# Altium footprint library TeCrea-Misc.PCBLIB: 105 footprints (part 4 of 7)
Each footprint in its own frame and in the unit in brackets; x right, y up, seen from the top. Pads: shape width x height; smd on the part's side, far side on the other; paste and mask are expansions set on the pad; w line width, h text height; cw(c..) or ccw(c..) is an arc to the next point about the centre after c.
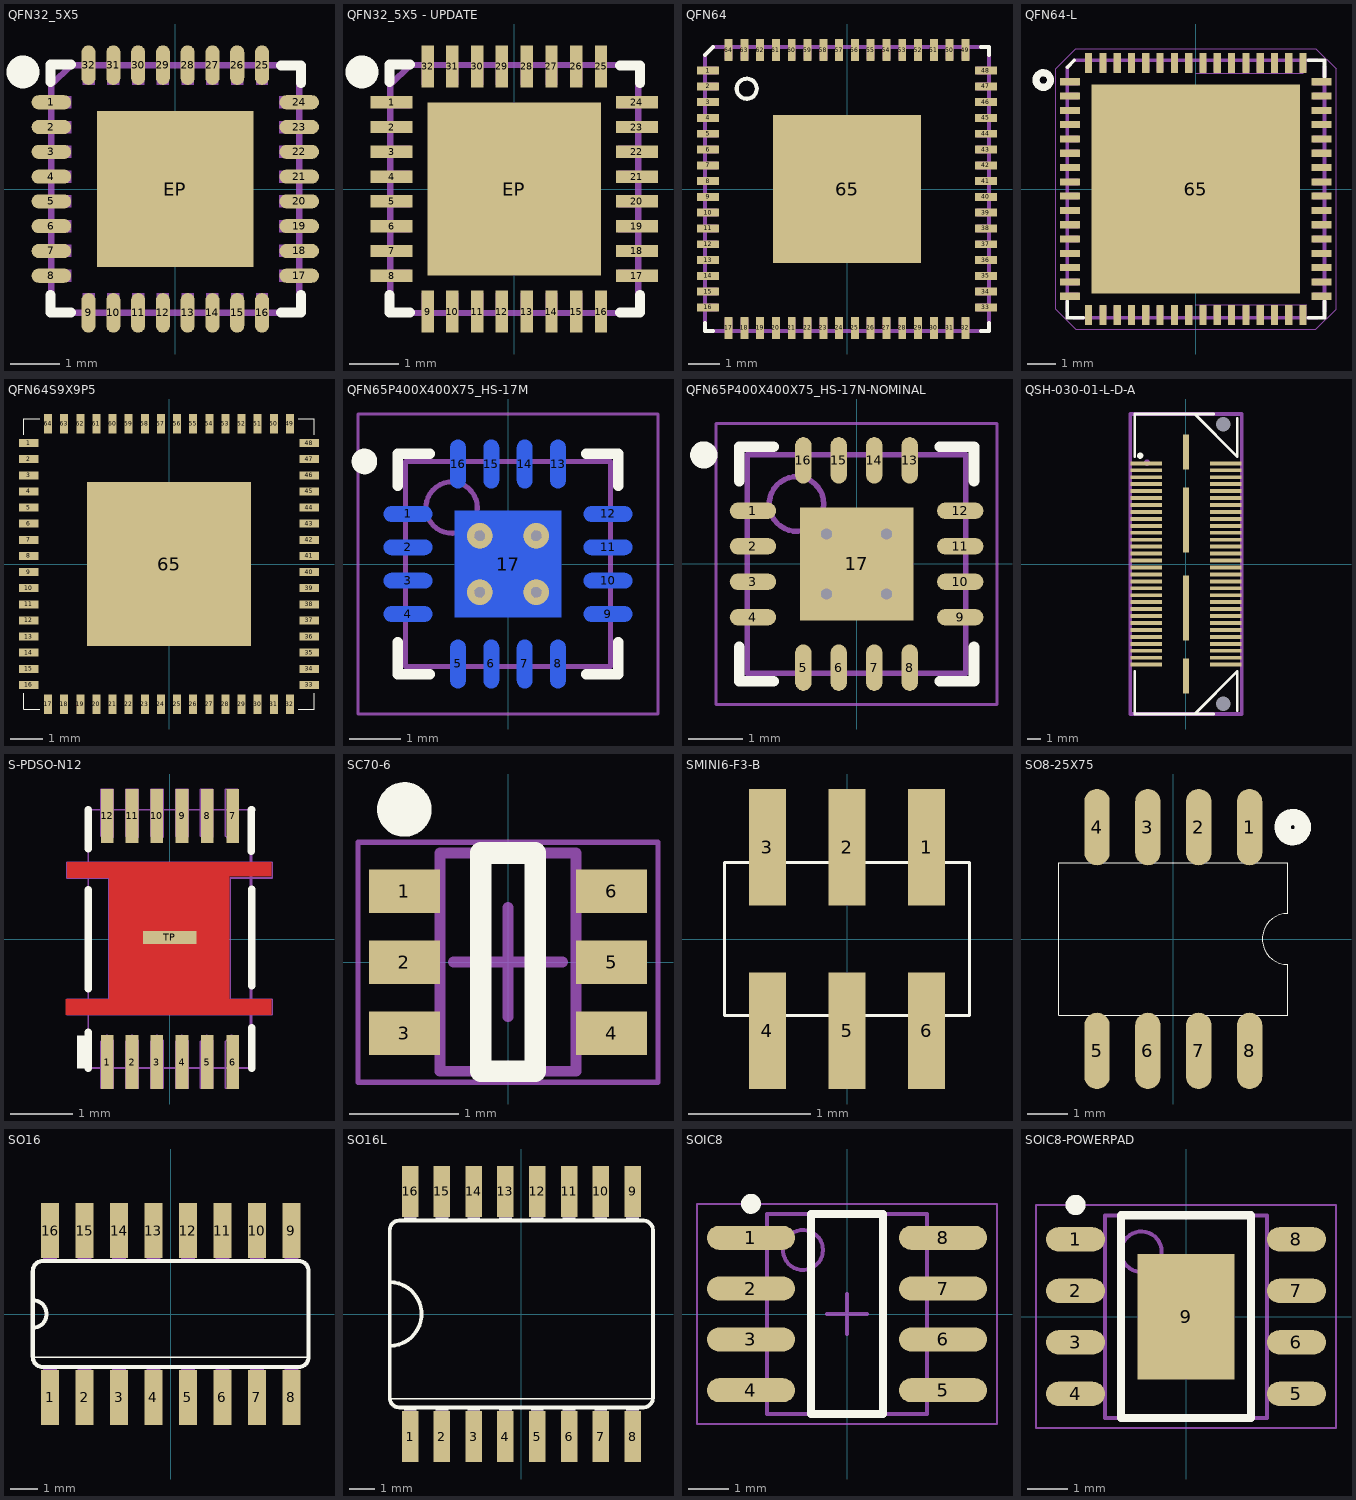
[diagram p3: the footprints below, top view; thin cyan lines are the x and y axes]

## QFN32_5X5 [mil]
pads (33):
  oval 31.5x11.2 smd: 1(-98.43,68.9) 2(-98.43,49.21) 3(-98.43,29.53) 4(-98.43,9.84) 5(-98.43,-9.84) 6(-98.43,-29.53) 7(-98.43,-49.21) 8(-98.43,-68.9) 17(98.43,-68.9) 18(98.43,-49.21) 19(98.43,-29.53) 20(98.43,-9.84) 21(98.43,9.84) 22(98.43,29.53) 23(98.43,49.21) 24(98.43,68.9)
  oval 11.2x31.5 smd: 9(-68.9,-98.43) 10(-49.21,-98.43) 11(-29.53,-98.43) 12(-9.84,-98.43) 13(9.84,-98.43) 14(29.53,-98.43) 15(49.21,-98.43) 16(68.9,-98.43) 25(68.9,98.43) 26(49.21,98.43) 27(29.53,98.43) 28(9.84,98.43) 29(-9.84,98.43) 30(-29.53,98.43) 31(-49.21,98.43) 32(-68.9,98.43)
  rect 124.02x124.02 smd paste+0: EP(0,0)
Top Overlay:
  circle w19.68: c-121,93 r3.16
  lines w7.87: -99,-84 -99,-98 -83,-98 ; -99,85 -99,99 -83,99 ; 84,-98 100,-98 100,-84 ; 84,98 100,98 100,84
Top Paste:
  region: 57.09,-5.91 57.09,-57.09 5.91,-57.09 5.91,-5.91
  region: -5.91,-57.09 -57.09,-57.09 -57.09,-5.91 -5.91,-5.91
  region: 5.91,57.09 57.09,57.09 57.09,5.91 5.91,5.91
  region: -57.09,5.91 -57.09,57.09 -5.91,57.09 -5.91,5.91
Mechanical 8:
  region: -64.17,-98.43 -73.62,-98.43 -73.62,-82.68 -64.17,-82.68
  region: -44.49,-98.43 -53.94,-98.43 -53.94,-82.68 -44.49,-82.68
  region: -24.8,-98.43 -34.25,-98.43 -34.25,-82.68 -24.8,-82.68
  region: 73.62,-98.43 64.17,-98.43 64.17,-82.68 73.62,-82.68
  region: 53.94,-98.43 44.49,-98.43 44.49,-82.68 53.94,-82.68
  region: 34.25,-98.43 24.8,-98.43 24.8,-82.68 34.25,-82.68
  region: 14.57,-98.43 5.12,-98.43 5.12,-82.68 14.57,-82.68
  region: -5.12,-98.43 -14.57,-98.43 -14.57,-82.68 -5.12,-82.68
  region: -98.43,64.17 -98.43,73.62 -82.68,73.62 -82.68,64.17
  region: -98.43,44.49 -98.43,53.94 -82.68,53.94 -82.68,44.49
  region: -98.43,24.8 -98.43,34.25 -82.68,34.25 -82.68,24.8
  region: -98.43,-73.62 -98.43,-64.17 -82.68,-64.17 -82.68,-73.62
  region: -98.43,-53.94 -98.43,-44.49 -82.68,-44.49 -82.68,-53.94
  region: -98.43,-34.25 -98.43,-24.8 -82.68,-24.8 -82.68,-34.25
  region: -98.43,-14.57 -98.43,-5.12 -82.68,-5.12 -82.68,-14.57
  region: -98.43,5.12 -98.43,14.57 -82.68,14.57 -82.68,5.12
  region: 98.43,-64.17 98.43,-73.62 82.68,-73.62 82.68,-64.17
  region: 98.43,-44.49 98.43,-53.94 82.68,-53.94 82.68,-44.49
  region: 98.43,-24.8 98.43,-34.25 82.68,-34.25 82.68,-24.8
  region: 98.43,73.62 98.43,64.17 82.68,64.17 82.68,73.62
  region: 98.43,53.94 98.43,44.49 82.68,44.49 82.68,53.94
  region: 98.43,34.25 98.43,24.8 82.68,24.8 82.68,34.25
  region: 98.43,14.57 98.43,5.12 82.68,5.12 82.68,14.57
  region: 98.43,-5.12 98.43,-14.57 82.68,-14.57 82.68,-5.12
  region: 64.17,98.43 73.62,98.43 73.62,82.68 64.17,82.68
  region: 44.49,98.43 53.94,98.43 53.94,82.68 44.49,82.68
  region: 24.8,98.43 34.25,98.43 34.25,82.68 24.8,82.68
  region: -73.62,98.43 -64.17,98.43 -64.17,82.68 -73.62,82.68
  region: -53.94,98.43 -44.49,98.43 -44.49,82.68 -53.94,82.68
  region: -34.25,98.43 -24.8,98.43 -24.8,82.68 -34.25,82.68
  region: -14.57,98.43 -5.12,98.43 -5.12,82.68 -14.57,82.68
  region: 5.12,98.43 14.57,98.43 14.57,82.68 5.12,82.68
  lines w5: -98.43,-98.43 98.43,-98.43 98.43,98.43 -98.43,98.43 -98.43,-98.43
Mechanical 22:
  lines w5: -98.43,-82.68 -98.43,-98.43 -82.68,-98.43 ; -98.43,82.68 -82.68,98.43 ; 82.68,-98.43 98.43,-98.43 98.43,-82.68 ; 82.68,98.43 98.43,98.43 98.43,82.68
3D body "QFN32-5x5.step": height 31.5, standoff 0, extent -98.81,-98.81 98.83,98.83

## QFN32_5X5 - UPDATE [mm]
pads (33):
  rect 0.85x0.25 smd mask+0.068: 1(-2.475,1.75) 2(-2.475,1.25) 3(-2.475,0.75) 4(-2.475,0.25) 5(-2.475,-0.25) 6(-2.475,-0.75) 7(-2.475,-1.25) 8(-2.475,-1.75) 17(2.475,-1.75) 18(2.475,-1.25) 19(2.475,-0.75) 20(2.475,-0.25) 21(2.475,0.25) 22(2.475,0.75) 23(2.475,1.25) 24(2.475,1.75)
  rect 0.25x0.85 smd mask+0.068: 9(-1.75,-2.475) 10(-1.25,-2.475) 11(-0.75,-2.475) 12(-0.25,-2.475) 13(0.25,-2.475) 14(0.75,-2.475) 15(1.25,-2.475) 16(1.75,-2.475) 25(1.75,2.475) 26(1.25,2.475) 27(0.75,2.475) 28(0.25,2.475) 29(-0.25,2.475) 30(-0.75,2.475) 31(-1.25,2.475) 32(-1.75,2.475)
  rect 3.5x3.5 smd mask+0.068: EP(0,0)
Top Overlay:
  circle w0.5: c-3.073,2.362 r0.08
  lines w0.2: -2.515,-2.134 -2.515,-2.489 -2.108,-2.489 ; -2.515,2.159 -2.515,2.515 -2.108,2.515 ; 2.134,-2.489 2.54,-2.489 2.54,-2.134 ; 2.134,2.489 2.54,2.489 2.54,2.134
Top Paste:
  region: -1.45,0.15 -1.45,1.45 -0.15,1.45 -0.15,0.15
  region: 0.15,1.45 1.45,1.45 1.45,0.15 0.15,0.15
  region: -0.15,-1.45 -1.45,-1.45 -1.45,-0.15 -0.15,-0.15
  region: 1.45,-0.15 1.45,-1.45 0.15,-1.45 0.15,-0.15
Mechanical 8:
  region: 0.13,2.5 0.37,2.5 0.37,2.1 0.13,2.1
  region: -0.37,2.5 -0.13,2.5 -0.13,2.1 -0.37,2.1
  region: -0.87,2.5 -0.63,2.5 -0.63,2.1 -0.87,2.1
  region: -1.37,2.5 -1.13,2.5 -1.13,2.1 -1.37,2.1
  region: -1.87,2.5 -1.63,2.5 -1.63,2.1 -1.87,2.1
  region: 0.63,2.5 0.87,2.5 0.87,2.1 0.63,2.1
  region: 1.13,2.5 1.37,2.5 1.37,2.1 1.13,2.1
  region: 1.63,2.5 1.87,2.5 1.87,2.1 1.63,2.1
  region: 2.5,-0.13 2.5,-0.37 2.1,-0.37 2.1,-0.13
  region: 2.5,0.37 2.5,0.13 2.1,0.13 2.1,0.37
  region: 2.5,0.87 2.5,0.63 2.1,0.63 2.1,0.87
  region: 2.5,1.37 2.5,1.13 2.1,1.13 2.1,1.37
  region: 2.5,1.87 2.5,1.63 2.1,1.63 2.1,1.87
  region: 2.5,-0.63 2.5,-0.87 2.1,-0.87 2.1,-0.63
  region: 2.5,-1.13 2.5,-1.37 2.1,-1.37 2.1,-1.13
  region: 2.5,-1.63 2.5,-1.87 2.1,-1.87 2.1,-1.63
  region: -2.5,0.13 -2.5,0.37 -2.1,0.37 -2.1,0.13
  region: -2.5,-0.37 -2.5,-0.13 -2.1,-0.13 -2.1,-0.37
  region: -2.5,-0.87 -2.5,-0.63 -2.1,-0.63 -2.1,-0.87
  region: -2.5,-1.37 -2.5,-1.13 -2.1,-1.13 -2.1,-1.37
  region: -2.5,-1.87 -2.5,-1.63 -2.1,-1.63 -2.1,-1.87
  region: -2.5,0.63 -2.5,0.87 -2.1,0.87 -2.1,0.63
  region: -2.5,1.13 -2.5,1.37 -2.1,1.37 -2.1,1.13
  region: -2.5,1.63 -2.5,1.87 -2.1,1.87 -2.1,1.63
  region: -0.13,-2.5 -0.37,-2.5 -0.37,-2.1 -0.13,-2.1
  region: 0.37,-2.5 0.13,-2.5 0.13,-2.1 0.37,-2.1
  region: 0.87,-2.5 0.63,-2.5 0.63,-2.1 0.87,-2.1
  region: 1.37,-2.5 1.13,-2.5 1.13,-2.1 1.37,-2.1
  region: 1.87,-2.5 1.63,-2.5 1.63,-2.1 1.87,-2.1
  region: -0.63,-2.5 -0.87,-2.5 -0.87,-2.1 -0.63,-2.1
  region: -1.13,-2.5 -1.37,-2.5 -1.37,-2.1 -1.13,-2.1
  region: -1.63,-2.5 -1.87,-2.5 -1.87,-2.1 -1.63,-2.1
  lines w0.127: -2.5,-2.5 -2.5,2.5 2.5,2.5 2.5,-2.5 -2.5,-2.5
Mechanical 22:
  lines w0.127: -2.5,-2.1 -2.5,-2.5 -2.1,-2.5 ; -2.5,2.1 -2.1,2.5 ; 2.1,-2.5 2.5,-2.5 2.5,-2.1 ; 2.1,2.5 2.5,2.5 2.5,2.1
3D body "QFN32-5x5.step": height 0.8, standoff 0, extent -2.51,-2.51 2.51,2.51

## QFN64 [mm]
pads (65):
  rect 0.7x0.25 smd: 1(-4.4,3.75) 2(-4.4,3.25) 3(-4.4,2.75) 4(-4.4,2.25) 5(-4.4,1.75) 6(-4.4,1.25) 7(-4.4,0.75) 8(-4.4,0.25) 9(-4.4,-0.25) 10(-4.4,-0.75) 11(-4.4,-1.25) 12(-4.4,-1.75) 13(-4.4,-2.25) 14(-4.4,-2.75) 15(-4.4,-3.25) 16(-4.4,-3.75) 33(4.4,-3.75) 34(4.4,-3.25) 35(4.4,-2.75) 36(4.4,-2.25) 37(4.4,-1.75) 38(4.4,-1.25) 39(4.4,-0.75) 40(4.4,-0.25) 41(4.4,0.25) 42(4.4,0.75) 43(4.4,1.25) 44(4.4,1.75) 45(4.4,2.25) 46(4.4,2.75) 47(4.4,3.25) 48(4.4,3.75)
  rect 0.25x0.7 smd: 17(-3.75,-4.4) 18(-3.25,-4.4) 19(-2.75,-4.4) 20(-2.25,-4.4) 21(-1.75,-4.4) 22(-1.25,-4.4) 23(-0.75,-4.4) 24(-0.25,-4.4) 25(0.25,-4.4) 26(0.75,-4.4) 27(1.25,-4.4) 28(1.75,-4.4) 29(2.25,-4.4) 30(2.75,-4.4) 31(3.25,-4.4) 32(3.75,-4.4) 49(3.75,4.4) 50(3.25,4.4) 51(2.75,4.4) 52(2.25,4.4) 53(1.75,4.4) 54(1.25,4.4) 55(0.75,4.4) 56(0.25,4.4) 57(-0.25,4.4) 58(-0.75,4.4) 59(-1.25,4.4) 60(-1.75,4.4) 61(-2.25,4.4) 62(-2.75,4.4) 63(-3.25,4.4) 64(-3.75,4.4)
  rect 4.7x4.7 smd: 65(0,0)
Top Overlay:
  circle w0.127: c-3.175,3.175 r0.318
  lines w0.127: -4.5,-4.25 -4.5,-4.5 -4.25,-4.5 ; -4.5,4.25 -4.25,4.5 ; 4.25,-4.5 4.5,-4.5 4.5,-4.25 ; 4.25,4.5 4.5,4.5 4.5,4.25
Mechanical 16:
  region: 3.625,4.5 3.625,4.1 3.875,4.1 3.875,4.5
  region: 3.125,4.5 3.125,4.1 3.375,4.1 3.375,4.5
  region: 2.625,4.5 2.625,4.1 2.875,4.1 2.875,4.5
  region: 2.125,4.5 2.125,4.1 2.375,4.1 2.375,4.5
  region: 1.625,4.5 1.625,4.1 1.875,4.1 1.875,4.5
  region: 1.125,4.5 1.125,4.1 1.375,4.1 1.375,4.5
  region: 0.625,4.5 0.625,4.1 0.875,4.1 0.875,4.5
  region: 0.125,4.5 0.125,4.1 0.375,4.1 0.375,4.5
  region: -0.375,4.5 -0.375,4.1 -0.125,4.1 -0.125,4.5
  region: -0.875,4.5 -0.875,4.1 -0.625,4.1 -0.625,4.5
  region: -1.375,4.5 -1.375,4.1 -1.125,4.1 -1.125,4.5
  region: -1.875,4.5 -1.875,4.1 -1.625,4.1 -1.625,4.5
  region: -2.375,4.5 -2.375,4.1 -2.125,4.1 -2.125,4.5
  region: -2.875,4.5 -2.875,4.1 -2.625,4.1 -2.625,4.5
  region: -3.375,4.5 -3.375,4.1 -3.125,4.1 -3.125,4.5
  region: -3.875,4.5 -3.875,4.1 -3.625,4.1 -3.625,4.5
  region: 3.625,-4.1 3.625,-4.5 3.875,-4.5 3.875,-4.1
  region: 3.125,-4.1 3.125,-4.5 3.375,-4.5 3.375,-4.1
  region: 2.625,-4.1 2.625,-4.5 2.875,-4.5 2.875,-4.1
  region: 2.125,-4.1 2.125,-4.5 2.375,-4.5 2.375,-4.1
  region: 1.625,-4.1 1.625,-4.5 1.875,-4.5 1.875,-4.1
  region: 1.125,-4.1 1.125,-4.5 1.375,-4.5 1.375,-4.1
  region: 0.625,-4.1 0.625,-4.5 0.875,-4.5 0.875,-4.1
  region: 0.125,-4.1 0.125,-4.5 0.375,-4.5 0.375,-4.1
  region: -0.375,-4.1 -0.375,-4.5 -0.125,-4.5 -0.125,-4.1
  region: -0.875,-4.1 -0.875,-4.5 -0.625,-4.5 -0.625,-4.1
  region: -1.375,-4.1 -1.375,-4.5 -1.125,-4.5 -1.125,-4.1
  region: -1.875,-4.1 -1.875,-4.5 -1.625,-4.5 -1.625,-4.1
  region: -2.375,-4.1 -2.375,-4.5 -2.125,-4.5 -2.125,-4.1
  region: -2.875,-4.1 -2.875,-4.5 -2.625,-4.5 -2.625,-4.1
  region: -3.375,-4.1 -3.375,-4.5 -3.125,-4.5 -3.125,-4.1
  region: -3.875,-4.1 -3.875,-4.5 -3.625,-4.5 -3.625,-4.1
  rectangle: -4.5,3.625 -4.1,3.875
  rectangle: -4.5,3.125 -4.1,3.375
  rectangle: -4.5,2.625 -4.1,2.875
  rectangle: -4.5,2.125 -4.1,2.375
  rectangle: -4.5,1.625 -4.1,1.875
  rectangle: -4.5,1.125 -4.1,1.375
  rectangle: -4.5,0.625 -4.1,0.875
  rectangle: -4.5,0.125 -4.1,0.375
  rectangle: -4.5,-0.375 -4.1,-0.125
  rectangle: -4.5,-0.875 -4.1,-0.625
  rectangle: -4.5,-1.375 -4.1,-1.125
  rectangle: -4.5,-1.875 -4.1,-1.625
  rectangle: -4.5,-2.375 -4.1,-2.125
  rectangle: -4.5,-2.875 -4.1,-2.625
  rectangle: -4.5,-3.375 -4.1,-3.125
  rectangle: -4.5,-3.875 -4.1,-3.625
  rectangle: 4.1,-3.875 4.5,-3.625
  rectangle: 4.1,-3.375 4.5,-3.125
  rectangle: 4.1,-2.875 4.5,-2.625
  rectangle: 4.1,-2.375 4.5,-2.125
  rectangle: 4.1,-1.875 4.5,-1.625
  rectangle: 4.1,-1.375 4.5,-1.125
  rectangle: 4.1,-0.875 4.5,-0.625
  rectangle: 4.1,-0.375 4.5,-0.125
  rectangle: 4.1,0.125 4.5,0.375
  rectangle: 4.1,0.625 4.5,0.875
  rectangle: 4.1,1.125 4.5,1.375
  rectangle: 4.1,1.625 4.5,1.875
  rectangle: 4.1,2.125 4.5,2.375
  rectangle: 4.1,2.625 4.5,2.875
  rectangle: 4.1,3.125 4.5,3.375
  rectangle: 4.1,3.625 4.5,3.875
  lines w0.127: -4.5,-4.25 -4.5,4.25 ; -4.25,-4.5 4.25,-4.5 ; -4.25,4.5 4.25,4.5 ; 4.5,-4.25 4.5,4.25
3D body "User Library-ZM7300G Series-QFN64.step": height 0.9, standoff 0, extent -4.51,-4.524 4.51,4.496

## QFN64-L [mm]
pads (65):
  rect 0.7x0.25 smd: 1(-4.4,3.75) 2(-4.4,3.25) 3(-4.4,2.75) 4(-4.4,2.25) 5(-4.4,1.75) 6(-4.4,1.25) 7(-4.4,0.75) 8(-4.4,0.25) 9(-4.4,-0.25) 10(-4.4,-0.75) 11(-4.4,-1.25) 12(-4.4,-1.75) 13(-4.4,-2.25) 14(-4.4,-2.75) 15(-4.4,-3.25) 16(-4.4,-3.75) 33(4.4,-3.75) 34(4.4,-3.25) 35(4.4,-2.75) 36(4.4,-2.25) 37(4.4,-1.75) 38(4.4,-1.25) 39(4.4,-0.75) 40(4.4,-0.25) 41(4.4,0.25) 42(4.4,0.75) 43(4.4,1.25) 44(4.4,1.75) 45(4.4,2.25) 46(4.4,2.75) 47(4.4,3.25) 48(4.4,3.75)
  rect 0.25x0.7 smd: 17(-3.75,-4.4) 18(-3.25,-4.4) 19(-2.75,-4.4) 20(-2.25,-4.4) 21(-1.75,-4.4) 22(-1.25,-4.4) 23(-0.75,-4.4) 24(-0.25,-4.4) 25(0.25,-4.4) 26(0.75,-4.4) 27(1.25,-4.4) 28(1.75,-4.4) 29(2.25,-4.4) 30(2.75,-4.4) 31(3.25,-4.4) 32(3.75,-4.4) 49(3.75,4.4) 50(3.25,4.4) 51(2.75,4.4) 52(2.25,4.4) 53(1.75,4.4) 54(1.25,4.4) 55(0.75,4.4) 56(0.25,4.4) 57(-0.25,4.4) 58(-0.75,4.4) 59(-1.25,4.4) 60(-1.75,4.4) 61(-2.25,4.4) 62(-2.75,4.4) 63(-3.25,4.4) 64(-3.75,4.4)
  rect 7.3x7.3 smd: 65(0,0)
Top Overlay:
  circle w0.254: c-5.334,3.81 r0.254
  lines w0.127: -4.5,-3.932 -4.5,-4.5 -3.932,-4.5 ; -4.5,4.25 -4.25,4.5 ; 3.932,-4.5 4.5,-4.5 4.5,-3.932 ; 3.932,4.5 4.5,4.5 4.5,3.932
Bottom Overlay:
  lines w0.127: -4.508,3.937 -4.508,4.255 ; -4.255,4.508 -3.937,4.508
Mechanical 11:
  lines w0: -1,0 1,0 ; 0,-4.05 3.875,-4.05 ; 0,-1 0,1 ; 0,4.05 3.75,4.05
Mechanical 16:
  region: 3.625,4.5 3.625,4.1 3.875,4.1 3.875,4.5
  region: 3.125,4.5 3.125,4.1 3.375,4.1 3.375,4.5
  region: 2.625,4.5 2.625,4.1 2.875,4.1 2.875,4.5
  region: 2.125,4.5 2.125,4.1 2.375,4.1 2.375,4.5
  region: 1.625,4.5 1.625,4.1 1.875,4.1 1.875,4.5
  region: 1.125,4.5 1.125,4.1 1.375,4.1 1.375,4.5
  region: 0.625,4.5 0.625,4.1 0.875,4.1 0.875,4.5
  region: 0.125,4.5 0.125,4.1 0.375,4.1 0.375,4.5
  region: -0.375,4.5 -0.375,4.1 -0.125,4.1 -0.125,4.5
  region: -0.875,4.5 -0.875,4.1 -0.625,4.1 -0.625,4.5
  region: -1.375,4.5 -1.375,4.1 -1.125,4.1 -1.125,4.5
  region: -1.875,4.5 -1.875,4.1 -1.625,4.1 -1.625,4.5
  region: -2.375,4.5 -2.375,4.1 -2.125,4.1 -2.125,4.5
  region: -2.875,4.5 -2.875,4.1 -2.625,4.1 -2.625,4.5
  region: -3.375,4.5 -3.375,4.1 -3.125,4.1 -3.125,4.5
  region: -3.875,4.5 -3.875,4.1 -3.625,4.1 -3.625,4.5
  region: 3.625,-4.1 3.625,-4.5 3.875,-4.5 3.875,-4.1
  region: 3.125,-4.1 3.125,-4.5 3.375,-4.5 3.375,-4.1
  region: 2.625,-4.1 2.625,-4.5 2.875,-4.5 2.875,-4.1
  region: 2.125,-4.1 2.125,-4.5 2.375,-4.5 2.375,-4.1
  region: 1.625,-4.1 1.625,-4.5 1.875,-4.5 1.875,-4.1
  region: 1.125,-4.1 1.125,-4.5 1.375,-4.5 1.375,-4.1
  region: 0.625,-4.1 0.625,-4.5 0.875,-4.5 0.875,-4.1
  region: 0.125,-4.1 0.125,-4.5 0.375,-4.5 0.375,-4.1
  region: -0.375,-4.1 -0.375,-4.5 -0.125,-4.5 -0.125,-4.1
  region: -0.875,-4.1 -0.875,-4.5 -0.625,-4.5 -0.625,-4.1
  region: -1.375,-4.1 -1.375,-4.5 -1.125,-4.5 -1.125,-4.1
  region: -1.875,-4.1 -1.875,-4.5 -1.625,-4.5 -1.625,-4.1
  region: -2.375,-4.1 -2.375,-4.5 -2.125,-4.5 -2.125,-4.1
  region: -2.875,-4.1 -2.875,-4.5 -2.625,-4.5 -2.625,-4.1
  region: -3.375,-4.1 -3.375,-4.5 -3.125,-4.5 -3.125,-4.1
  region: -3.875,-4.1 -3.875,-4.5 -3.625,-4.5 -3.625,-4.1
  rectangle: -4.5,3.625 -4.1,3.875
  rectangle: -4.5,3.125 -4.1,3.375
  rectangle: -4.5,2.625 -4.1,2.875
  rectangle: -4.5,2.125 -4.1,2.375
  rectangle: -4.5,1.625 -4.1,1.875
  rectangle: -4.5,1.125 -4.1,1.375
  rectangle: -4.5,0.625 -4.1,0.875
  rectangle: -4.5,0.125 -4.1,0.375
  rectangle: -4.5,-0.375 -4.1,-0.125
  rectangle: -4.5,-0.875 -4.1,-0.625
  rectangle: -4.5,-1.375 -4.1,-1.125
  rectangle: -4.5,-1.875 -4.1,-1.625
  rectangle: -4.5,-2.375 -4.1,-2.125
  rectangle: -4.5,-2.875 -4.1,-2.625
  rectangle: -4.5,-3.375 -4.1,-3.125
  rectangle: -4.5,-3.875 -4.1,-3.625
  rectangle: 4.1,-3.875 4.5,-3.625
  rectangle: 4.1,-3.375 4.5,-3.125
  rectangle: 4.1,-2.875 4.5,-2.625
  rectangle: 4.1,-2.375 4.5,-2.125
  rectangle: 4.1,-1.875 4.5,-1.625
  rectangle: 4.1,-1.375 4.5,-1.125
  rectangle: 4.1,-0.875 4.5,-0.625
  rectangle: 4.1,-0.375 4.5,-0.125
  rectangle: 4.1,0.125 4.5,0.375
  rectangle: 4.1,0.625 4.5,0.875
  rectangle: 4.1,1.125 4.5,1.375
  rectangle: 4.1,1.625 4.5,1.875
  rectangle: 4.1,2.125 4.5,2.375
  rectangle: 4.1,2.625 4.5,2.875
  rectangle: 4.1,3.125 4.5,3.375
  rectangle: 4.1,3.625 4.5,3.875
  lines w0.127: -4.5,-4.25 -4.5,4.25 ; -4.25,-4.5 4.25,-4.5 ; -4.25,4.5 4.25,4.5 ; 4.5,-4.25 4.5,4.25
Mechanical 37:
  lines w0: -4.9,-4.2 -4.2,-4.9 4.2,-4.9 4.9,-4.2 4.9,4.2 4.2,4.9 -4.2,4.9 -4.9,4.2 -4.9,-4.2
3D body "User Library-QFN64-2.step": height 0.9, standoff 0, extent -4.52,-4.52 4.52,4.52

## QFN64S9X9P5 [mm] "QFN64S9X9P5"
pads (65):
  rect 0.6x0.25 smd mask+0.051: 1(-4.35,3.75) 2(-4.35,3.25) 3(-4.35,2.75) 4(-4.35,2.25) 5(-4.35,1.75) 6(-4.35,1.25) 7(-4.35,0.75) 8(-4.35,0.25) 9(-4.35,-0.25) 10(-4.35,-0.75) 11(-4.35,-1.25) 12(-4.35,-1.75) 13(-4.35,-2.25) 14(-4.35,-2.75) 15(-4.35,-3.25) 16(-4.35,-3.75) 33(4.35,-3.75) 34(4.35,-3.25) 35(4.35,-2.75) 36(4.35,-2.25) 37(4.35,-1.75) 38(4.35,-1.25) 39(4.35,-0.75) 40(4.35,-0.25) 41(4.35,0.25) 42(4.35,0.75) 43(4.35,1.25) 44(4.35,1.75) 45(4.35,2.25) 46(4.35,2.75) 47(4.35,3.25) 48(4.35,3.75)
  rect 0.25x0.6 smd mask+0.051: 17(-3.75,-4.35) 18(-3.25,-4.35) 19(-2.75,-4.35) 20(-2.25,-4.35) 21(-1.75,-4.35) 22(-1.25,-4.35) 23(-0.75,-4.35) 24(-0.25,-4.35) 25(0.25,-4.35) 26(0.75,-4.35) 27(1.25,-4.35) 28(1.75,-4.35) 29(2.25,-4.35) 30(2.75,-4.35) 31(3.25,-4.35) 32(3.75,-4.35) 49(3.75,4.35) 50(3.25,4.35) 51(2.75,4.35) 52(2.25,4.35) 53(1.75,4.35) 54(1.25,4.35) 55(0.75,4.35) 56(0.25,4.35) 57(-0.25,4.35) 58(-0.75,4.35) 59(-1.25,4.35) 60(-1.75,4.35) 61(-2.25,4.35) 62(-2.75,4.35) 63(-3.25,4.35) 64(-3.75,4.35)
  rect 5.08x5.08 smd mask+0.051: 65(0,0)
Top Overlay:
  lines w0.025: -4.5,-4 -4.5,-4.5 -4,-4.5 ; -4.5,4 -4.5,4.5 -4,4.5 ; 4,-4.5 4.5,-4.5 4.5,-4 ; 4,4.5 4.5,4.5 4.5,4
3D body "QFN64-1EP_9x9mm_Pitch0.5mm.step": height 0.91, standoff 0, extent -4.5,-4.5 4.5,4.5

## QFN65P400X400X75_HS-17M [mm] "QFN, 16-Leads, Body 4,00x4,00mm, Pitch 0,65mm, Thermal Pad 2,08x2,08mm, IPC Low Density"
height 0.75
pads (17):
  oval 0.95x0.3 smd far side: 1(-1.95,0.975) 2(-1.95,0.325) 3(-1.95,-0.325) 4(-1.95,-0.975) 9(1.95,-0.975) 10(1.95,-0.325) 11(1.95,0.325) 12(1.95,0.975)
  oval 0.3x0.95 smd far side: 5(-0.975,-1.95) 6(-0.325,-1.95) 7(0.325,-1.95) 8(0.975,-1.95) 13(0.975,1.95) 14(0.325,1.95) 15(-0.325,1.95) 16(-0.975,1.95)
  rect 2.08x2.08 smd far side: 17(0,0)
via -0.55,0.55 diameter 0.5 hole 0.2
via 0.55,0.55 diameter 0.5 hole 0.2
via -0.55,-0.55 diameter 0.5 hole 0.2
via 0.55,-0.55 diameter 0.5 hole 0.2
Top Overlay:
  circle w0.25: c-2.8,2 r0.125
  lines w0.2: -2.15,-1.525 -2.15,-2.15 -1.525,-2.15 ; -2.15,1.525 -2.15,2.15 -1.525,2.15 ; 1.525,-2.15 2.15,-2.15 2.15,-1.525 ; 1.525,2.15 2.15,2.15 2.15,1.525
Mechanical 13:
  circle w0.1: c-1.1,1.1 r0.5
  lines w0.1: -2,-2 -2,2 2,2 2,-2 -2,-2
Mechanical 15:
  lines w0.05: -2.925,-2.925 -2.925,2.925 2.925,2.925 2.925,-2.925 -2.925,-2.925
  lines w0.1: -0.5,0 0.5,0 ; 0,-0.5 0,0.5
3D body "QFN65P400X400X75_HS-17M.step": height 0.75, standoff 0, extent -2.02,-2.02 2.02,2.02

## QFN65P400X400X75_HS-17N-NOMINAL [mm] "QFN, 16-Leads, Body 4,00x4,00mm, Pitch 0,65mm, Thermal Pad 2,08x2,08mm, IPC Medium Density"
height 0.75
pads (17):
  oval 0.85x0.3 smd: 1(-1.9,0.975) 2(-1.9,0.325) 3(-1.9,-0.325) 4(-1.9,-0.975) 9(1.9,-0.975) 10(1.9,-0.325) 11(1.9,0.325) 12(1.9,0.975)
  oval 0.3x0.85 smd: 5(-0.975,-1.9) 6(-0.325,-1.9) 7(0.325,-1.9) 8(0.975,-1.9) 13(0.975,1.9) 14(0.325,1.9) 15(-0.325,1.9) 16(-0.975,1.9)
  rect 2.08x2.08 smd: 17(0,0)
via 0.55,-0.55 diameter 0.5 hole 0.2
via -0.55,-0.55 diameter 0.5 hole 0.2
via 0.55,0.55 diameter 0.5 hole 0.2
via -0.55,0.55 diameter 0.5 hole 0.2
Top Overlay:
  circle w0.25: c-2.8,2 r0.125
  lines w0.2: -2.15,-1.525 -2.15,-2.15 -1.525,-2.15 ; -2.15,1.525 -2.15,2.15 -1.525,2.15 ; 1.525,-2.15 2.15,-2.15 2.15,-1.525 ; 1.525,2.15 2.15,2.15 2.15,1.525
Mechanical 13:
  circle w0.1: c-1.1,1.1 r0.5
  lines w0.1: -2,-2 2,-2 2,2 -2,2 -2,-2
Mechanical 15:
  lines w0.05: -2.575,-2.575 2.575,-2.575 2.575,2.575 -2.575,2.575 -2.575,-2.575
  lines w0.1: -0.5,0 0.5,0 ; 0,-0.5 0,0.5
3D body "QFN65P400X400X75_HS-17N.step": height 0.75, standoff 0, extent -2.02,-2.02 2.02,2.02

## QSH-030-01-L-D-A [mm]
pads (66):
  rect 2.27x0.28 smd mask+0.051: 1(-2.87,7.25) 2(2.87,7.25) 3(-2.87,6.75) 4(2.87,6.75) 5(-2.87,6.25) 6(2.87,6.25) 7(-2.87,5.75) 8(2.87,5.75) 9(-2.87,5.25) 10(2.87,5.25) 11(-2.87,4.75) 12(2.87,4.75) 13(-2.87,4.25) 14(2.87,4.25) 15(-2.87,3.75) 16(2.87,3.75) 17(-2.87,3.25) 18(2.87,3.25) 19(-2.87,2.75) 20(2.87,2.75) 21(-2.87,2.25) 22(2.87,2.25) 23(-2.87,1.75) 24(2.87,1.75) 25(-2.87,1.25) 26(2.87,1.25) 27(-2.87,0.75) 28(2.87,0.75) 29(-2.87,0.25) 30(2.87,0.25) 31(-2.87,-0.25) 32(2.87,-0.25) 33(-2.87,-0.75) 34(2.87,-0.75) 35(-2.87,-1.25) 36(2.87,-1.25) 37(-2.87,-1.75) 38(2.87,-1.75) 39(-2.87,-2.25) 40(2.87,-2.25) 41(-2.87,-2.75) 42(2.87,-2.75) 43(-2.87,-3.25) 44(2.87,-3.25) 45(-2.87,-3.75) 46(2.87,-3.75) 47(-2.87,-4.25) 48(2.87,-4.25) 49(-2.87,-4.75) 50(2.87,-4.75) 51(-2.87,-5.25) 52(2.87,-5.25) 53(-2.87,-5.75) 54(2.87,-5.75) 55(-2.87,-6.25) 56(2.87,-6.25) 57(-2.87,-6.75) 58(2.87,-6.75) 59(-2.87,-7.25) 60(2.87,-7.25)
  rect 0.43x2.54 smd mask+0.076: 61(0,8.065) 64(0,-8.065)
  rect 0.43x4.7 smd mask+0.076: 62(0,3.175) 63(0,-3.175)
  round 0 hole 1.05 unplated: 65(2.67,10.065) 66(2.67,-10.065)
Top Overlay:
  circle w0.254: c-3.3,7.8 r0.1
  lines w0.2: -3.683,-7.747 -3.683,-10.8 2,-10.8 ; -3.683,7.747 -3.683,10.8 2,10.8 ; 0,-10.8 0.63,-10.8 3.683,-7.747 3.683,-10.541 ; 0,10.8 0.63,10.8 3.683,7.747 3.683,10.5
Mechanical 16:
  circle w0.254: c-2.8,7.3 r0.1
  lines w0.254: -4,-10.8 4,-10.8 4,10.8 -4,10.8 -4,-10.8
Mechanical 29:
  text ".Designator" at 0.5,-6.9 h1.52
3D body "QSH-030-01-X-D-A.step": height 3.42, standoff -0.58, extent -3.746,-10.635 3.747,10.637

## S-PDSO-N12 [mil]
pads (13):
  rect 8x34 smd: 1(-39.69,-77.88) 2(-23.94,-77.88) 3(-8.19,-77.88) 4(7.69,-77.88) 5(23.69,-77.88) 6(39.69,-77.88) 7(39.69,77.88) 8(23.69,77.88) 9(7.69,77.88) 10(-8.19,77.88) 11(-23.94,77.88) 12(-39.69,77.88)
  rect 34x8 smd: TP(0,0.98)
Top Layer:
  region: -64.76,48.48 64.18,48.48 64.18,39.62 37.61,39.62 37.61,-38.14 64.18,-38.14 64.18,-47.98 -65.74,-47.98 -65.74,-38.14 -38.18,-38.14 -38.18,38.63 -64.76,38.63
Top Overlay:
  rectangle: -58.7,-81.81 -51.49,-61.14
  lines w1: -51.73,-31.54 -51.69,31.14 ; -51.5,-81.81 -51.5,-58.98 ; -51.5,56.93 -51.5,81.88 ; 51.54,55.35 51.69,81.88 ; 51.65,-56.02 51.69,-81.81 ; 51.73,-29.68 51.73,31.5
  lines w4.72: -51.73,-31.54 -51.69,-31.54 -51.69,31.14 -51.73,31.14 ; -51.5,-81.81 -51.5,-58.98 ; -51.5,56.93 -51.5,81.88 ; 51.54,55.35 51.54,81.88 51.69,81.88 ; 51.65,-56.02 51.69,-56.02 51.69,-81.81 ; 51.73,-29.68 51.73,31.5 ; -51.5,81.88 -51.5,81.88
Mechanical 16:
  drawing of 283 lines, arcs and shapes, not listed
3D body: height 39.76, standoff 0, extent -46.28,-57.11 -38.31,-49.13
3D body: height 39.37, standoff 0, extent -51.31,-82.12 51.69,81.88

## SC70-6 [mm] "SC70-6, Body 2.00x2.10mm, Pitch 0.65mm, IPC High Density"
height 1.1
pads (6):
  rect 0.65x0.4 smd: 1(-0.95,0.65) 2(-0.95,0) 3(-0.95,-0.65) 4(0.95,-0.65) 5(0.95,0) 6(0.95,0.65)
Top Overlay:
  circle w0.25: c-0.95,1.4 r0.125
  lines w0.2: -0.25,-1 0.25,-1 0.25,1 -0.25,1 -0.25,-1
Mechanical 13:
  lines w0.1: -0.625,-1 -0.625,1 0.625,1 0.625,-1 -0.625,-1
Mechanical 15:
  lines w0.05: -1.375,-1.1 -1.375,1.1 1.375,1.1 1.375,-1.1 -1.375,-1.1
  lines w0.1: -0.5,0 0.5,0 ; 0,-0.5 0,0.5
3D body "SC70-6.step": height 1, standoff -0.1, extent -1.05,-1 1.05,1

## SMINI6-F3-B [mil] "SMINI6-F3-B"
pads (6):
  rect 12x37.4 smd mask+2: 1(25.59,29.53) 2(0,29.53) 3(-25.59,29.53) 4(-25.59,-29.53) 5(0,-29.53) 6(25.59,-29.53)
Top Overlay:
  lines w1: -39.37,-24.61 39.37,-24.61 39.37,24.61 -39.37,24.61 -39.37,-24.61
3D body "SOT363.step": height 39.37, standoff 0, extent -41.35,-45.28 41.33,45.27

## SO8-25X75 [mil] "SO8-25X75"
pads (8):
  oval 25x75 smd mask+2: 1(75,110) 2(25,110) 3(-25,110) 4(-75,110) 5(-75,-110) 6(-25,-110) 7(25,-110) 8(75,-110)
Top Overlay:
  circle w6: c117.5,110 r15
  circle w6: c117.5,110 r10
  circle w6: c117.5,110 r5
  lines w1: -112.5,-75 112.5,-75 112.5,-25 cw(c112.5,0) 112.5,25 112.5,75 -112.5,75 -112.5,-75
3D body "SO8-3.step": height 66.93, standoff 0, extent -96.45,-118.11 96.46,118.11

## SO16 [mil]
pads (16):
  rect 26x80 smd: 1(-175,-121) 2(-125,-121) 3(-75,-121) 4(-25,-121) 5(25,-121) 6(75,-121) 7(125,-121) 8(175,-121) 9(175,121) 10(125,121) 11(75,121) 12(25,121) 13(-25,121) 14(-75,121) 15(-125,121) 16(-175,121)
Top Overlay:
  lines w2: -200,-63 200,-63
  lines w6: -200,-20 ccw(c-200,0) -200,20 ; -200,-20 -200,-62 ccw(c-185,-62) -185,-77 185,-77 ccw(c185,-62) 200,-62 200,62 ccw(c185,62) 185,77 -185,77 ccw(c-185,62) -200,62 -200,20 ; -200,-20 -200,20
Mechanical 16:
  rectangle: 165,77 185,122
  rectangle: 115,77 135,122
  rectangle: 65,77 85,122
  rectangle: 15,77 35,122
  rectangle: 165,-122 185,-77
  rectangle: 115,-122 135,-77
  rectangle: 65,-122 85,-77
  rectangle: 15,-122 35,-77
  rectangle: -185,77 -165,122
  rectangle: -135,77 -115,122
  rectangle: -85,77 -65,122
  rectangle: -35,-122 -15,-77
  rectangle: -85,-121 -65,-76
  rectangle: -135,-122 -115,-77
  rectangle: -185,-122 -165,-77
  rectangle: -35,77 -15,122
3D body "SOIC16_10x4.step": height 68.9, standoff 0, extent -195.87,-116.13 197.83,120.09

## SO16L [mil]
pads (16):
  rect 26x80 smd: 1(-175,-193) 2(-125,-193) 3(-75,-193) 4(-25,-193) 5(25,-193) 6(75,-193) 7(125,-193) 8(175,-193) 9(175,193) 10(125,193) 11(75,193) 12(25,193) 13(-25,193) 14(-75,193) 15(-125,193) 16(-175,193)
Top Overlay:
  rectangle: 165,147 185,152
  rectangle: 115,147 135,152
  rectangle: 65,147 85,152
  rectangle: 15,147 35,152
  rectangle: -35,147 -15,152
  rectangle: -85,147 -65,152
  rectangle: -135,147 -115,152
  rectangle: -185,147 -165,152
  rectangle: 165,-152 185,-147
  rectangle: 115,-152 135,-147
  rectangle: 65,-152 85,-147
  rectangle: 15,-152 35,-147
  rectangle: -35,-152 -15,-147
  rectangle: -85,-152 -65,-147
  rectangle: -135,-152 -115,-147
  rectangle: -185,-152 -165,-147
  lines w2: -205,-133 206,-133
  lines w6: -207,-50 ccw(c-207,0) -207,50 ; -207,-50 -207,-132 ccw(c-192,-132) -192,-147 192,-147 ccw(c192,-132) 207,-132 207,132 ccw(c192,132) 192,147 -192,147 ccw(c-192,132) -207,132 -207,50 ; -207,-50 -207,50
Mechanical 16:
  rectangle: 165,152 185,210
  rectangle: 115,152 135,210
  rectangle: 65,152 85,210
  rectangle: 15,152 35,210
  rectangle: -35,152 -15,210
  rectangle: -85,152 -65,210
  rectangle: -135,152 -115,210
  rectangle: -185,152 -165,210
  rectangle: 165,-210 185,-152
  rectangle: 115,-210 135,-152
  rectangle: 65,-210 85,-152
  rectangle: 15,-210 35,-152
  rectangle: -35,-210 -15,-152
  rectangle: -85,-210 -65,-152
  rectangle: -135,-210 -115,-152
  rectangle: -185,-210 -165,-152

## SOIC8 [mm] "SOIC, 8-Leads, Body 4.9x3.9mm, Pitch 1.27mm, IPC Medium Density"
height 1.75
pads (8):
  oval 2.2x0.6 smd: 1(-2.4,1.905) 2(-2.4,0.635) 3(-2.4,-0.635) 4(-2.4,-1.905) 5(2.4,-1.905) 6(2.4,-0.635) 7(2.4,0.635) 8(2.4,1.905)
Top Overlay:
  circle w0.25: c-2.4,2.755 r0.125
  lines w0.2: -0.9,-2.5 0.9,-2.5 0.9,2.5 -0.9,2.5 -0.9,-2.5
Mechanical 13:
  circle w0.1: c-1.1,1.6 r0.5
  lines w0.1: -2,-2.5 2,-2.5 2,2.5 -2,2.5 -2,-2.5
Mechanical 15:
  lines w0.05: -3.75,-2.75 3.75,-2.75 3.75,2.75 -3.75,2.75 -3.75,-2.75
  lines w0.1: -0.5,0 0.5,0 ; 0,-0.5 0,0.5
3D body "SOIC8-1.step": height 1.75, standoff 0, extent -3,-2.45 3,2.45

## SOIC8-POWERPAD [mm]
height 1.7
pads (9):
  oval 1.45x0.6 smd: 1(-2.725,1.905) 2(-2.725,0.635) 3(-2.725,-0.635) 4(-2.725,-1.905) 5(2.725,-1.905) 6(2.725,-0.635) 7(2.725,0.635) 8(2.725,1.905)
  rect 2.4x3.1 smd: 9(0,0)
Top Overlay:
  circle w0.25: c-2.725,2.755 r0.125
  lines w0.2: -1.6,-2.5 1.6,-2.5 1.6,2.5 -1.6,2.5 -1.6,-2.5
Courtyard Top:
  lines w0.05: -3.7,-2.75 3.7,-2.75 3.7,2.75 -3.7,2.75 -3.7,-2.75
  lines w0.1: -0.5,0 0.5,0 ; 0,-0.5 0,0.5
Assembly Top:
  circle w0.1: c-1.1,1.6 r0.5
  lines w0.1: -2,-2.5 2,-2.5 2,2.5 -2,2.5 -2,-2.5
3D body "SOIC8-POWERPAD.step": height 1.7, standoff 0, extent -3,-2.5 3,2.5